# Altium footprint library Vowstar_Connector.PcbLib: 127 footprints (part 4 of 8)
Each footprint in its own frame and in the unit in brackets; x right, y up, seen from the top. Pads: shape width x height; smd on the part's side, far side on the other; paste and mask are expansions set on the pad; w line width, h text height; cw(c..) or ccw(c..) is an arc to the next point about the centre after c.
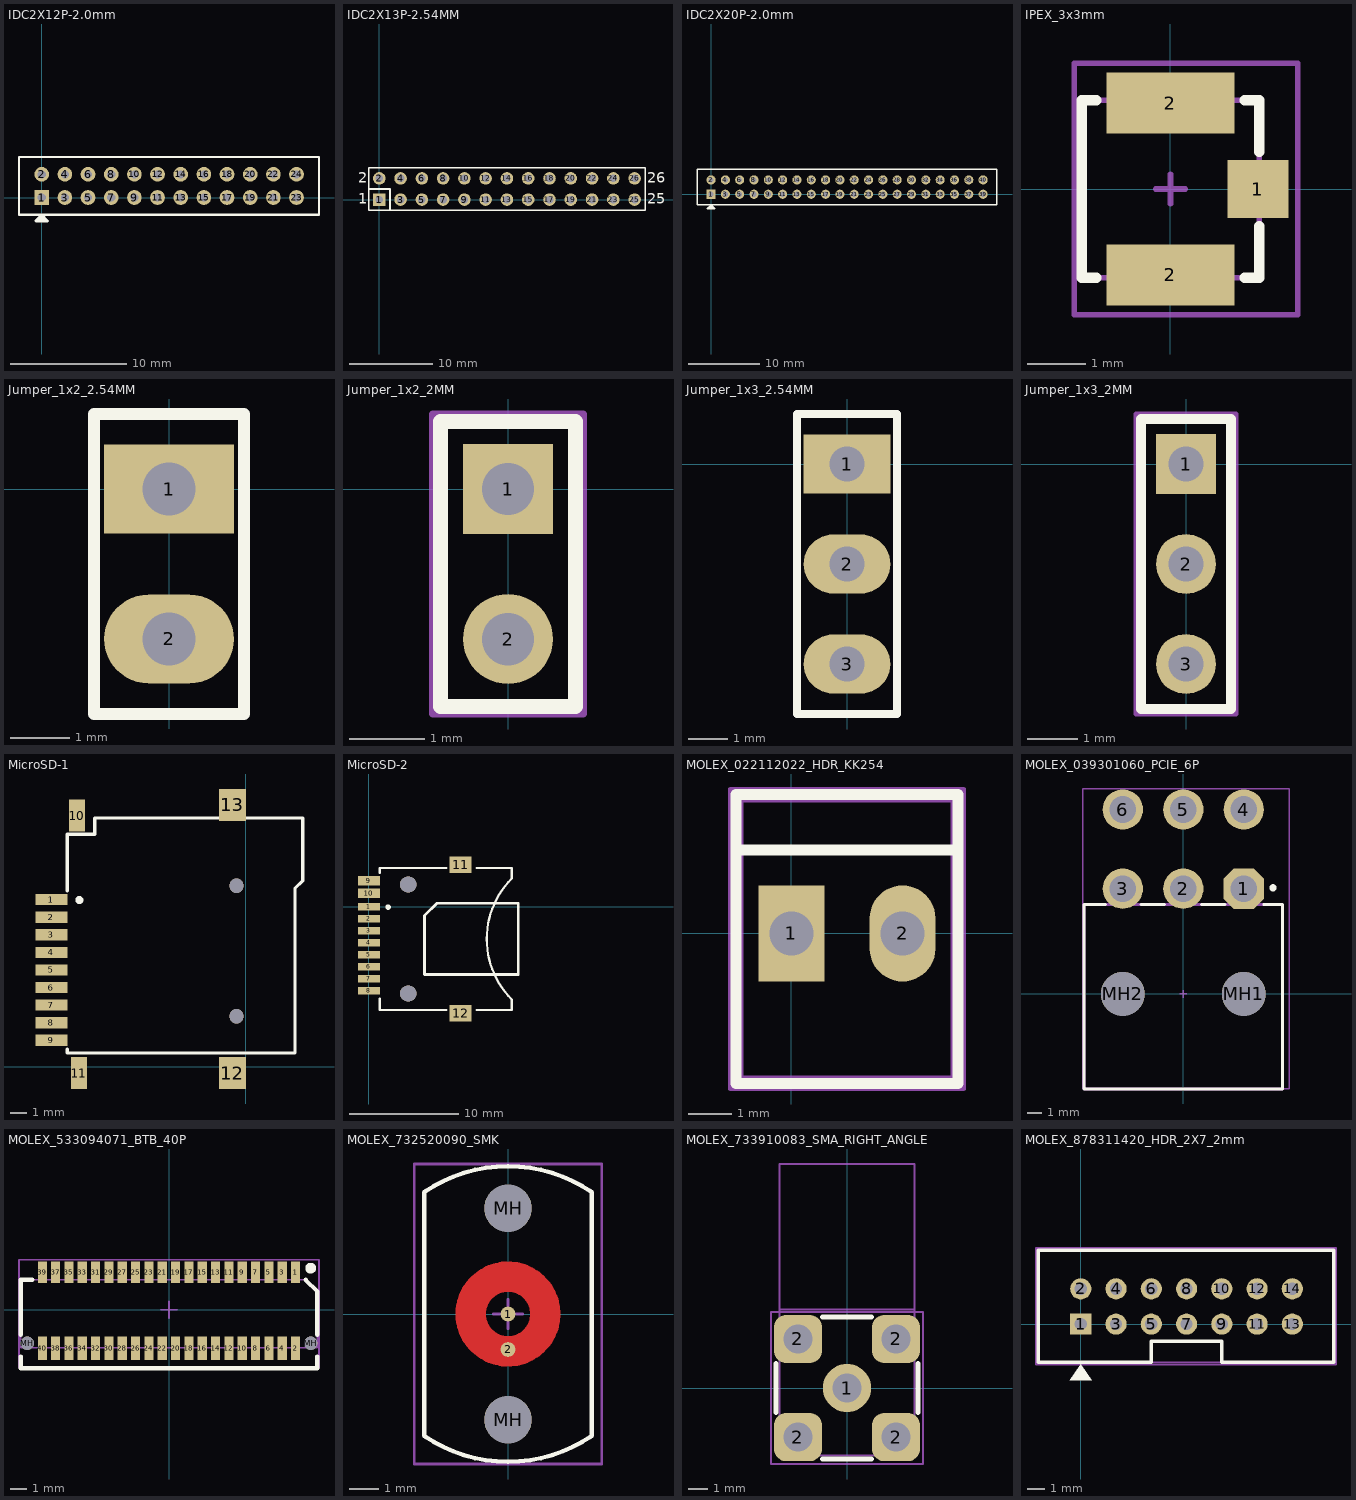
[diagram p3: the footprints below, top view; thin cyan lines are the x and y axes]

## IDC2X12P-2.0mm [mm]
pads (24):
  rect 1.27x1.27 hole 0.7: 1(0,0)
  round 1.27 hole 0.7: 2(0,2) 3(2,0) 4(2,2) 5(4,0) 6(4,2) 7(6,0) 8(6,2) 9(8,0) 10(8,2) 11(10,0) 12(10,2) 13(12,0) 14(12,2) 15(14,0) 16(14,2) 17(16,0) 18(16,2) 19(18,0) 20(18,2) 21(20,0) 22(20,2) 23(22,0) 24(22,2)
Top Overlay:
  lines w0.2: -1.961,-1.5 23.939,-1.5 23.939,3.5 -1.961,3.5 -1.961,-1.5
  lines w0.254: -0.361,-1.885 0.331,-1.885 ; -0.246,-1.77 0.246,-1.77 ; 0,-1.5 0,-1.524 ; 0,-1.524 0.508,-2.032 -0.508,-2.032 0,-1.524

## IDC2X13P-2.54MM [mm] "Connector; Header; 13x2 Position"
height 1.5
pads (26):
  rect 1.5x1.5 hole 0.9: 1(0,0)
  round 1.5 hole 0.9: 2(0,2.54) 3(2.54,0) 4(2.54,2.54) 5(5.08,0) 6(5.08,2.54) 7(7.62,0) 8(7.62,2.54) 9(10.16,0) 10(10.16,2.54) 11(12.7,0) 12(12.7,2.54) 13(15.24,0) 14(15.24,2.54) 15(17.78,0) 16(17.78,2.54) 17(20.32,0) 18(20.32,2.54) 19(22.86,0) 20(22.86,2.54) 21(25.4,0) 22(25.4,2.54) 23(27.94,0) 24(27.94,2.54) 25(30.48,0) 26(30.48,2.54)
Top Overlay:
  lines w0.2: -1.143,1.27 1.27,1.27 1.27,-1.27 ; -1.27,-1.27 -1.27,3.81 31.75,3.81 31.75,-1.27 -1.27,-1.27
  text "2" at -2.54,2.032 h1.27
  text "1" at -2.54,-0.508 h1.27
  text "25" at 32.004,-0.508 h1.27
  text "26" at 32.004,2.032 h1.27

## IDC2X20P-2.0mm [mm]
pads (40):
  rect 1.27x1.27 hole 0.7: 1(0,0)
  round 1.27 hole 0.7: 2(0,2) 3(2,0) 4(2,2) 5(4,0) 6(4,2) 7(6,0) 8(6,2) 9(8,0) 10(8,2) 11(10,0) 12(10,2) 13(12,0) 14(12,2) 15(14,0) 16(14,2) 17(16,0) 18(16,2) 19(18,0) 20(18,2) 21(20,0) 22(20,2) 23(22,0) 24(22,2) 25(24,0) 26(24,2) 27(26,0) 28(26,2) 29(28,0) 30(28,2) 31(30,0) 32(30,2) 33(32,0) 34(32,2) 35(34,0) 36(34,2) 37(36,0) 38(36,2) 39(38,0) 40(38,2)
Top Overlay:
  lines w0.2: -1.961,-1.5 39.939,-1.5 39.939,3.5 -1.961,3.5 -1.961,-1.5
  lines w0.254: -0.361,-1.885 0.331,-1.885 ; -0.246,-1.77 0.246,-1.77 ; 0,-1.5 0,-1.524 ; 0,-1.524 0.508,-2.032 -0.508,-2.032 0,-1.524

## IPEX_3x3mm [mm] "U.FL-R-SMT"
height 1.25
pads (3):
  rect 1.05x1 smd: 1(1.5,0)
  rect 2.2x1.05 smd mask+0.102: 2(0,-1.475)
  rect 2.2x1.05 smd: 2(0,1.475)
Top Overlay:
  lines w0.178: -1.27,-1.524 -1.524,-1.524 -1.524,1.524 -1.27,1.524 ; 1.27,-1.524 1.524,-1.524 1.524,-0.635 ; 1.27,1.524 1.524,1.524 1.524,0.635
Mechanical 13:
  lines w0.1: -1.524,-1.524 1.524,-1.524 1.524,1.524 -1.524,1.524 -1.524,-1.524
Mechanical 15:
  lines w0.1: -0.254,0 0.254,0 ; 0,-0.254 0,0.254 ; -1.651,-2.159 2.184,-2.159 2.184,2.159 -1.651,2.159 -1.651,-2.159
3D body "User Library-U_FL-R-SMT-1.step": height 1.25, standoff -0.01, extent -1.55,-1.5 1.55,1.5

## Jumper_1x2_2.54MM [mm] "Jumper"
height 1.5
pads (2):
  rect 2.2x1.5 hole 0.9: 1(0,0)
  oval 2.2x1.5 hole 0.9: 2(0,-2.54)
Top Overlay:
  lines w0.2: -1.27,-3.81 1.27,-3.81 1.27,1.27 -1.27,1.27 -1.27,-3.81
3D body "User Library-SHORTING JUMPER.step": height 8.45, standoff 2.55, extent -1.27,-3.81 1.27,1.27
3D body "User Library-Male-Pin Header Strip-1x1-2.54mm.step": height 8.51, standoff -3.68, extent -1.46,-1.27 1.46,1.27
3D body "User Library-Male-Pin Header Strip-1x1-2.54mm.step": height 8.51, standoff -3.68, extent -1.46,-3.81 1.46,-1.27

## Jumper_1x2_2MM [mm] "Jumper"
height 1.5
pads (2):
  rect 1.2x1.2 hole 0.7: 1(0,0)
  round 1.2 hole 0.7: 2(0,-2)
Top Overlay:
  lines w0.2: -0.9,-2.9 -0.9,0.9 0.9,0.9 0.9,-2.9 -0.9,-2.9
Mechanical 13:
  lines w0.1: -1,-3 -1,1 1,1 1,-3 -1,-3
Mechanical 15:
  lines w0.1: -0.5,0 0.5,0 ; 0,-0.5 0,0.5 ; -1,-3 1,-3 1,1 -1,1 -1,-3
3D body "Pin Headers 1x02 Straight THT pitch 2mm BB02-FB021-XB1-4025S0-6T_rev2.1.STEP": height 6, standoff -2.5, extent -1,-3 1,1
3D body "User Library-Shorting Jumper-2.0mm.step": height 6.29, standoff 2.79, extent -0.95,-2.95 0.95,0.95

## Jumper_1x3_2.54MM [mm] "Jumper"
height 1.5
pads (3):
  rect 2.2x1.5 hole 0.9: 1(0,0)
  oval 2.2x1.5 hole 0.9: 2(0,-2.54) 3(0,-5.08)
Top Overlay:
  lines w0.2: -1.27,-6.35 -1.27,1.27 1.27,1.27 1.27,-6.35 -1.27,-6.35
3D body "User Library-Male-Pin Header Strip-1x1-2.54mm.step": height 8.51, standoff -3.68, extent -1.46,-3.81 1.46,-1.27
3D body "User Library-Male-Pin Header Strip-1x1-2.54mm.step": height 8.51, standoff -3.68, extent -1.46,-1.27 1.46,1.27
3D body "User Library-Male-Pin Header Strip-1x1-2.54mm.step": height 8.51, standoff -3.68, extent -1.46,-6.35 1.46,-3.81
3D body "User Library-SHORTING JUMPER.step": height 8.45, standoff 2.55, extent -1.27,-3.81 1.27,1.27

## Jumper_1x3_2MM [mm] "Jumper"
height 1.5
pads (3):
  rect 1.2x1.2 hole 0.7: 1(0,0)
  round 1.2 hole 0.7: 2(0,-2) 3(0,-4)
Top Overlay:
  lines w0.2: -0.9,-4.9 0.9,-4.9 0.9,0.9 -0.9,0.9 -0.9,-4.9
Mechanical 13:
  lines w0.1: -1,-5 -1,1 1,1 1,-5 -1,-5
Mechanical 15:
  lines w0.1: -0.5,0 0.5,0 ; 0,-0.5 0,0.5 ; -1,-5 1,-5 1,1 -1,1 -1,-5
3D body "User Library-Shorting Jumper-2.0mm.step": height 6.29, standoff 2.79, extent -0.95,-2.95 0.95,0.95
3D body "Pin Headers 1x03 Straight THT pitch 2mm BB02-FB031-XB1-4025S0-6T_rev2.1.STEP": height 6, standoff -2.5, extent -1,-5 1,1

## MicroSD-1 [mm] "MicroSD"
pads (13):
  rect 2x0.7 smd: 1(-12.167,10.439) 2(-12.167,9.339) 3(-12.167,8.239) 4(-12.167,7.139) 5(-12.167,6.039) 6(-12.167,4.939) 7(-12.167,3.839) 8(-12.167,2.739) 9(-12.167,1.639)
  rect 1x2 smd: 10(-10.566,15.697) 11(-10.439,-0.406)
  rect 1.7x2 smd: 12(-0.838,-0.406) 13(-0.838,16.358)
via -0.584,11.303 diameter 0.9 hole 0.9
via -0.584,3.15 diameter 0.9 hole 0.9
Top Overlay:
  circle w0.25: c-10.412,10.414 r0.125
  lines w0.2: -11.167,1.092 -11.167,0.838 -2.54,0.838 3.073,0.838 ; -11.167,10.998 -11.167,14.529 -9.449,14.529 -9.449,15.545 -8.433,15.545 3.556,15.545 3.556,11.62 3.067,11.131 3.067,0.847
3D body "User Library-Micro SD-MEM2055-00-190-01-A_revG.step": height 1.85, standoff -0.6, extent -11.816,0.127 3.434,16.127

## MicroSD-2 [mm] "MicroSD"
pads (12):
  rect 2x0.7 smd: 1(0,0) 2(0,-1.1) 3(0,-2.2) 4(0,-3.3) 5(0,-4.4) 6(0,-5.5) 7(0,-6.6) 8(0,-7.7)
  rect 2x0.85 smd: 9(0,2.4) 10(0,1.25)
  rect 2x1.5 smd: 11(8.4,3.87) 12(8.4,-9.77)
via 3.6,2.05 diameter 1.5 hole 1.5
via 3.6,-7.95 diameter 1.5 hole 1.5
Top Overlay:
  circle w0.25: c1.755,-0.025 r0.125
  lines w0.2: 1,-8.417 1,-9.465 7.103,-9.465 ; 1,3.108 1,3.565 7.103,3.565 ; 9.872,-9.465 13.1,-9.465 13.1,-8.5 cw(c18.65,-2.95) 13.1,2.6 13.1,3.565 9.872,3.565
  lines w0.254: 5.105,-6.198 5.105,-0.813 6.248,0.33 13.691,0.33 13.691,-6.198 5.105,-6.198

## MOLEX_022112022_HDR_KK254 [mm] "SlimStack Board-to-Board ConneKK 254 Solid Header, Vertical, with Friction Lock, 2 Circuits, Gold (Au) Plating"
height 10.66
pads (2):
  rect 1.5x2.2 hole 1: 1(0,0)
  oval 1.5x2.2 hole 1: 2(2.54,0)
Top Overlay:
  lines w0.254: -1.27,1.905 3.81,1.905 ; -1.27,-3.429 -1.27,3.175 3.81,3.175 3.81,-3.429 -1.27,-3.429
Mechanical 13:
  lines w0.1: -1.143,-3.302 -1.143,3.048 3.683,3.048 3.683,-3.302 -1.143,-3.302
Mechanical 15:
  lines w0.1: -0.5,0 0.5,0 ; 0,-0.5 0,0.5 ; -1.397,-3.556 3.937,-3.556 3.937,3.302 -1.397,3.302 -1.397,-3.556
3D body "022112022.STEP": height 10.68, standoff -3.54, extent -1.194,-3.251 3.734,3.099

## MOLEX_039301060_PCIE_6P [mm] "Mini-Fit Jr. Power Connectors Header, Dual Row, Right-Angle, with Snap-in Plastic Peg PCB Lock, 6  Circuits, PA Polyamide Nylon 6/6 94V-2, 2.54μm Matte Tin (Sn) Plating"
height 12
pads (8):
  oct 2.8x2.8 hole 1.85: 1(4.2,7.3)
  round 2.8 hole 1.85: 2(0,7.3) 3(-4.2,7.3) 4(4.2,12.8) 5(0,12.8) 6(-4.2,12.8)
  round 3.05 hole 3.05 unplated: MH1(4.2,0) MH2(-4.2,0)
Top Overlay:
  circle w0.25: c6.223,7.366 r0.125
  lines w0.2: -5.4,6.2 -6.9,6.2 -6.9,-6.6 6.9,-6.6 6.9,6.2 5.588,6.2 ; -2.93,6.2 -1.315,6.2 ; 1.27,6.2 2.885,6.2
Mechanical 13:
  lines w0.2: -6.9,-6.6 6.9,-6.6 6.9,6.2 -6.9,6.2 -6.9,-6.6
Mechanical 15:
  lines w0.1: -0.254,0 0.254,0 ; 0,-0.254 0,0.254 ; -6.985,-6.604 7.366,-6.604 7.366,14.224 -6.985,14.224 -6.985,-6.604
3D body "39-30-1060.stp": height 11.4, standoff -3.6, extent -6.858,-6.538 7.342,13.396

## MOLEX_533094071_BTB_40P [mm] "SlimStack Board-to-Board Connector, 0.80mm Pitch, Floating Series, Plug, 5.65 or  6.65mm Mated Height, 40 Circuits, Right-Angle, with Boss"
height 4.7
pads (42):
  rect 0.55x1.3 smd: 1(7.6,2.25) 3(6.8,2.25) 5(6,2.25) 7(5.2,2.25) 9(4.4,2.25) 11(3.6,2.25) 13(2.8,2.25) 15(2,2.25) 17(1.2,2.25) 19(0.4,2.25) 21(-0.4,2.25) 23(-1.2,2.25) 25(-2,2.25) 27(-2.8,2.25) 29(-3.6,2.25) 31(-4.4,2.25) 33(-5.2,2.25) 35(-6,2.25) 37(-6.8,2.25) 39(-7.6,2.25)
  rect 0.55x1.4 smd: 2(7.6,-2.3) 4(6.8,-2.3) 6(6,-2.3) 8(5.2,-2.3) 10(4.4,-2.3) 12(3.6,-2.3) 14(2.8,-2.3) 16(2,-2.3) 18(1.2,-2.3) 20(0.4,-2.3) 22(-0.4,-2.3) 24(-1.2,-2.3) 26(-2,-2.3) 28(-2.8,-2.3) 30(-3.6,-2.3) 32(-4.4,-2.3) 34(-5.2,-2.3) 36(-6,-2.3) 38(-6.8,-2.3) 40(-7.6,-2.3)
  round 0.8 hole 0.8 unplated: MH(-8.5,-2) MH(8.5,-2)
Top Overlay:
  circle w0.35: c8.5,2.5 r0.15
  lines w0.254: -8.9,-2.8 -8.9,-3.5 8.9,-3.5 8.9,-2.8 ; -8.9,-1.5 -8.9,1.8 -8.2,1.8 ; 8.2,1.8 8.9,1.1 8.9,-1.5
Mechanical 13:
  lines w0.1: -8.9,-2.275 -8.9,1.8 8.2,1.8 8.9,1.1 8.9,-2.275 -8.9,-2.275
Mechanical 15:
  lines w0.1: -0.5,0 0.5,0 ; 0,-0.5 0,0.5 ; -9,-3.5 -9,3 9,3 9,-3.5 -9,-3.5
3D body "533094071.STEP": height 4.67, standoff -0.53, extent -8.9,-2.65 8.9,2.45

## MOLEX_732520090_SMK [mm] "2.92mm SMK connector, 50 Ohms, Precision Test Connector, 2.92mm PCB Jack, Field Replaceable, 2 Hole  Flange, with 2 Screws 4.76mm, PCB Thickness 0.76-2.44mm"
height 10.92
pads (4):
  round 0.5 smd paste-10 mask+2: 1(0,0)
  round 0.5 smd paste-10 mask-10: 2(0,-1.2)
  round 1.6 hole 1.6 unplated: MH(0,-3.58) MH(0,3.58)
Top Layer:
  circle w1.03: c0,0 r1.265
Top Overlay:
  lines w0.15: -2.83,-4.128 ccw(c0,0) 2.83,-4.128 2.83,4.128 ccw(c0,0) -2.83,4.128 -2.83,-4.128
Mechanical 13:
  lines w0.1: -3.175,-5.08 -3.175,5.08 3.175,5.08 3.175,-5.08 -3.175,-5.08
Mechanical 15:
  lines w0.1: -0.5,0 0.5,0 ; 0,-0.5 0,0.5 ; -3.175,-5.08 3.175,-5.08 3.175,5.08 -3.175,5.08 -3.175,-5.08
3D body "732520090.STEP": height 10.93, standoff 0.01, extent -3.128,-5.004 3.129,5.004

## MOLEX_733910083_SMA_RIGHT_ANGLE [mm] "SMA RF Connectors 50 Ohms, SMA Right Angle PCB Jack, 0.02μm Gold (Au) Plated"
pads (5):
  round 2.5 hole 1.5: 1(0,0)
  rrect50% 2.5x2.5 hole 1.5: 2(-2.54,-2.54) 2(-2.54,2.54) 2(2.54,-2.54) 2(2.54,2.54)
Top Overlay:
  lines w0.254: -3.683,-1.27 -3.683,1.27 ; -1.27,-3.683 1.27,-3.683 ; -1.27,3.683 1.27,3.683 ; 3.683,-1.27 3.683,1.27
Mechanical 13:
  lines w0.1: -3.429,4.064 3.429,4.064 ; -3.505,-3.505 -3.505,11.608 3.505,11.608 3.505,-3.505 -3.505,-3.505
  text "PCB EDGE" at -0.889,4.318 h0.25
Mechanical 15:
  lines w0.1: -0.5,0 0.5,0 ; 0,-0.5 0,0.5 ; -3.937,-3.937 3.937,-3.937 3.937,3.937 -3.937,3.937 -3.937,-3.937
3D body "Samtec-SMA-J-P-H-RA-TH1 (1).step": height 3.24, standoff -10.86, extent -3.5,-3.5 3.5,11.6

## MOLEX_878311420_HDR_2X7_2mm [mm] "2.00mm Pitch, Milli-Grid PCB Header, Dual Row, Vertical, Through Hole, Shrouded, 14  Circuits, 0.38μm Gold (Au) Plating, with Center Polarization Slot, with Locking Window,  without PCB Locator, Tube"
height 6.4
pads (14):
  rect 1.2x1.2 hole 0.7: 1(0,0)
  round 1.2 hole 0.7: 2(0,2) 3(2,0) 4(2,2) 5(4,0) 6(4,2) 7(6,0) 8(6,2) 9(8,0) 10(8,2) 11(10,0) 12(10,2) 13(12,0) 14(12,2)
Top Overlay:
  region: -0.635,-3.175 0.635,-3.175 0,-2.286
  lines w0.2: -2.413,-2.159 -2.413,4.191 14.351,4.191 14.351,-2.159 8,-2.159 8,-0.975 4,-0.975 4,-2.159 -2.413,-2.159
Mechanical 13:
  lines w0.1: -2.413,-2.159 14.351,-2.159 14.351,4.191 -2.413,4.191 -2.413,-2.159
Mechanical 15:
  lines w0.1: -0.5,0 0.5,0 ; 0,-0.5 0,0.5 ; -2.54,-2.286 14.478,-2.286 14.478,4.318 -2.54,4.318 -2.54,-2.286
3D body "878311420.STEP": height 6.4, standoff -2.5, extent -2.356,-2.134 14.294,4.166